# Altium footprint library BASIC.PcbLib: 244 footprints (part 2 of 16)
Each footprint in its own frame and in the unit in brackets; x right, y up, seen from the top. Pads: shape width x height; smd on the part's side, far side on the other; paste and mask are expansions set on the pad; w line width, h text height; cw(c..) or ccw(c..) is an arc to the next point about the centre after c.
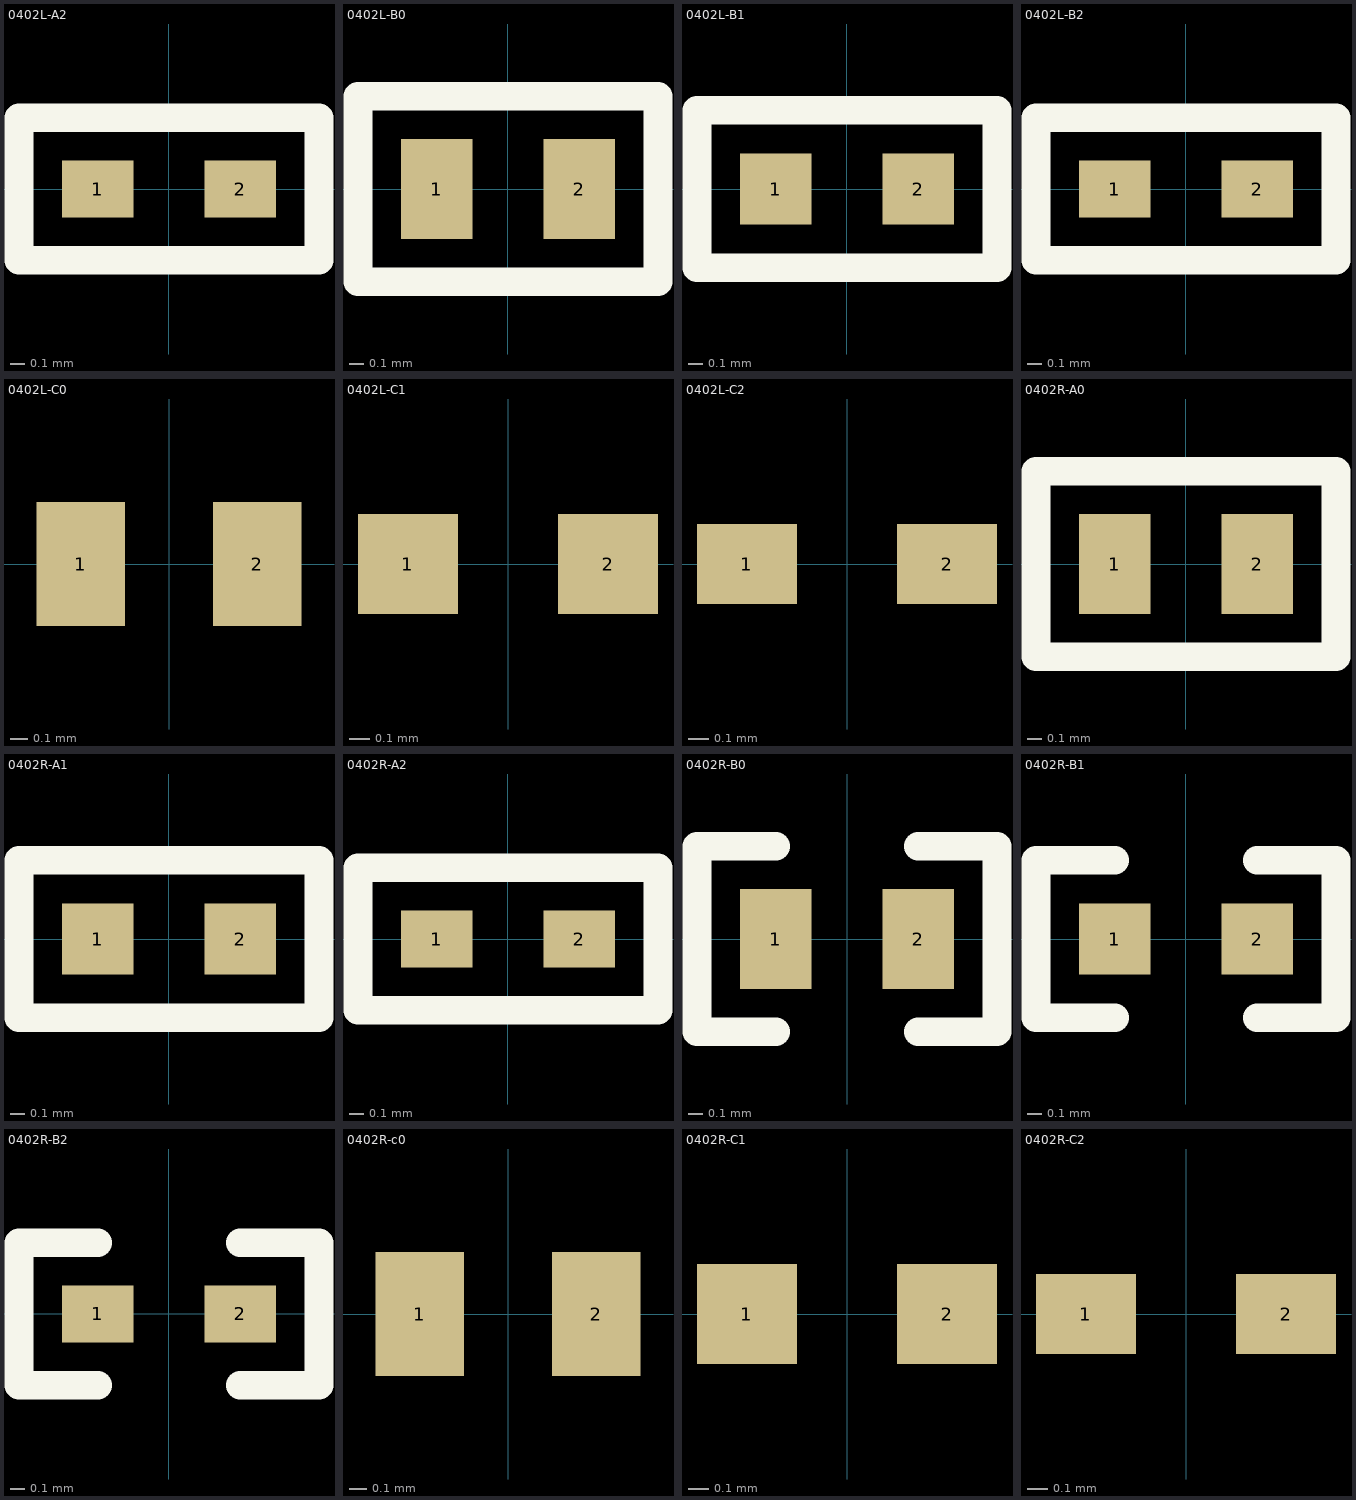
[diagram p1: the footprints below, top view; thin cyan lines are the x and y axes]

## 0402L-A2 [mm]
pads (2):
  rect 0.5x0.4 smd: 1(-0.5,0) 2(0.5,0)
Top Overlay:
  lines w0.2: -1.05,-0.5 1.05,-0.5 1.05,0.5 -1.05,0.5 -1.05,-0.5
3D body "0402L.stp": height 0.26, standoff -0.24, extent -0.5,-0.275 0.5,0.275

## 0402L-B0 [mm]
pads (2):
  rect 0.5x0.7 smd: 1(-0.5,0) 2(0.5,0)
Top Overlay:
  lines w0.2: -1.05,-0.65 1.05,-0.65 1.05,0.65 -1.05,0.65 -1.05,-0.65
3D body "0402L.stp": height 0.26, standoff -0.24, extent -0.5,-0.275 0.5,0.275

## 0402L-B1 [mm]
pads (2):
  rect 0.5x0.5 smd: 1(-0.5,0) 2(0.5,0)
Top Overlay:
  lines w0.2: -1.05,-0.55 -1.05,0.55 1.05,0.55 1.05,-0.55 -1.05,-0.55
3D body "0402L.stp": height 0.26, standoff -0.24, extent -0.5,-0.275 0.5,0.275

## 0402L-B2 [mm]
pads (2):
  rect 0.5x0.4 smd: 1(-0.5,0) 2(0.5,0)
Top Overlay:
  lines w0.2: -1.05,-0.5 1.05,-0.5 1.05,0.5 -1.05,0.5 -1.05,-0.5
3D body "0402L.stp": height 0.26, standoff -0.24, extent -0.5,-0.275 0.5,0.275

## 0402L-C0 [mm]
pads (2):
  rect 0.5x0.7 smd: 1(-0.5,0) 2(0.5,0)
3D body "0402L.stp": height 0.26, standoff -0.24, extent -0.5,-0.275 0.5,0.275

## 0402L-C1 [mm]
pads (2):
  rect 0.5x0.5 smd: 1(-0.5,0) 2(0.5,0)
3D body "0402L.stp": height 0.26, standoff -0.24, extent -0.5,-0.275 0.5,0.275

## 0402L-C2 [mm]
pads (2):
  rect 0.5x0.4 smd: 1(-0.5,0) 2(0.5,0)
3D body "0402L.stp": height 0.26, standoff -0.24, extent -0.5,-0.275 0.5,0.275

## 0402R-A0 [mm]
pads (2):
  rect 0.5x0.7 smd: 1(-0.5,0) 2(0.5,0)
Top Overlay:
  lines w0.2: -1.05,-0.65 1.05,-0.65 1.05,0.65 -1.05,0.65 -1.05,-0.65
3D body "RES0402.step": height 0.35, standoff 0, extent -0.5,-0.25 0.5,0.25

## 0402R-A1 [mm]
pads (2):
  rect 0.5x0.5 smd: 1(-0.5,0) 2(0.5,0)
Top Overlay:
  lines w0.2: -1.05,-0.55 -1.05,0.55 1.05,0.55 1.05,-0.55 -1.05,-0.55
3D body "RES0402.step": height 0.35, standoff 0, extent -0.5,-0.25 0.5,0.25

## 0402R-A2 [mm]
pads (2):
  rect 0.5x0.4 smd: 1(-0.5,0) 2(0.5,0)
Top Overlay:
  lines w0.2: -1.05,-0.5 1.05,-0.5 1.05,0.5 -1.05,0.5 -1.05,-0.5
3D body "RES0402.step": height 0.35, standoff 0, extent -0.5,-0.25 0.5,0.25

## 0402R-B0 [mm]
pads (2):
  rect 0.5x0.7 smd: 1(-0.5,0) 2(0.5,0)
Top Overlay:
  lines w0.2: -0.5,-0.65 -1.05,-0.65 -1.05,0.65 -0.5,0.65 ; 0.5,-0.65 1.05,-0.65 1.05,0.65 0.5,0.65
3D body "RES0402.step": height 0.35, standoff 0, extent -0.5,-0.25 0.5,0.25

## 0402R-B1 [mm]
pads (2):
  rect 0.5x0.5 smd: 1(-0.5,0) 2(0.5,0)
Top Overlay:
  lines w0.2: -0.5,-0.55 -1.05,-0.55 -1.05,0.55 -0.5,0.55 ; 0.5,-0.55 1.05,-0.55 1.05,0.55 0.5,0.55
3D body "RES0402.step": height 0.35, standoff 0, extent -0.5,-0.25 0.5,0.25

## 0402R-B2 [mm]
pads (2):
  rect 0.5x0.4 smd: 1(-0.5,0) 2(0.5,0)
Top Overlay:
  lines w0.2: -0.5,-0.5 -1.05,-0.5 -1.05,0.5 -0.5,0.5 ; 0.5,-0.5 1.05,-0.5 1.05,0.5 0.5,0.5
3D body "RES0402.step": height 0.35, standoff 0, extent -0.5,-0.25 0.5,0.25

## 0402R-c0 [mm]
pads (2):
  rect 0.5x0.7 smd: 1(-0.5,0) 2(0.5,0)
3D body "RES0402.step": height 0.35, standoff 0, extent -0.5,-0.25 0.5,0.25

## 0402R-C1 [mm]
pads (2):
  rect 0.5x0.5 smd: 1(-0.5,0) 2(0.5,0)
3D body "RES0402.step": height 0.35, standoff 0, extent -0.5,-0.25 0.5,0.25

## 0402R-C2 [mm]
pads (2):
  rect 0.5x0.4 smd: 1(-0.5,0) 2(0.5,0)
3D body "RES0402.step": height 0.35, standoff 0, extent -0.5,-0.25 0.5,0.25